# Altium footprint library 7-Connectors-9.PcbLib: 41 footprints (part 3 of 3)
Each footprint in its own frame and in the unit in brackets; x right, y up, seen from the top. Pads: shape width x height; smd on the part's side, far side on the other; paste and mask are expansions set on the pad; w line width, h text height; cw(c..) or ccw(c..) is an arc to the next point about the centre after c.
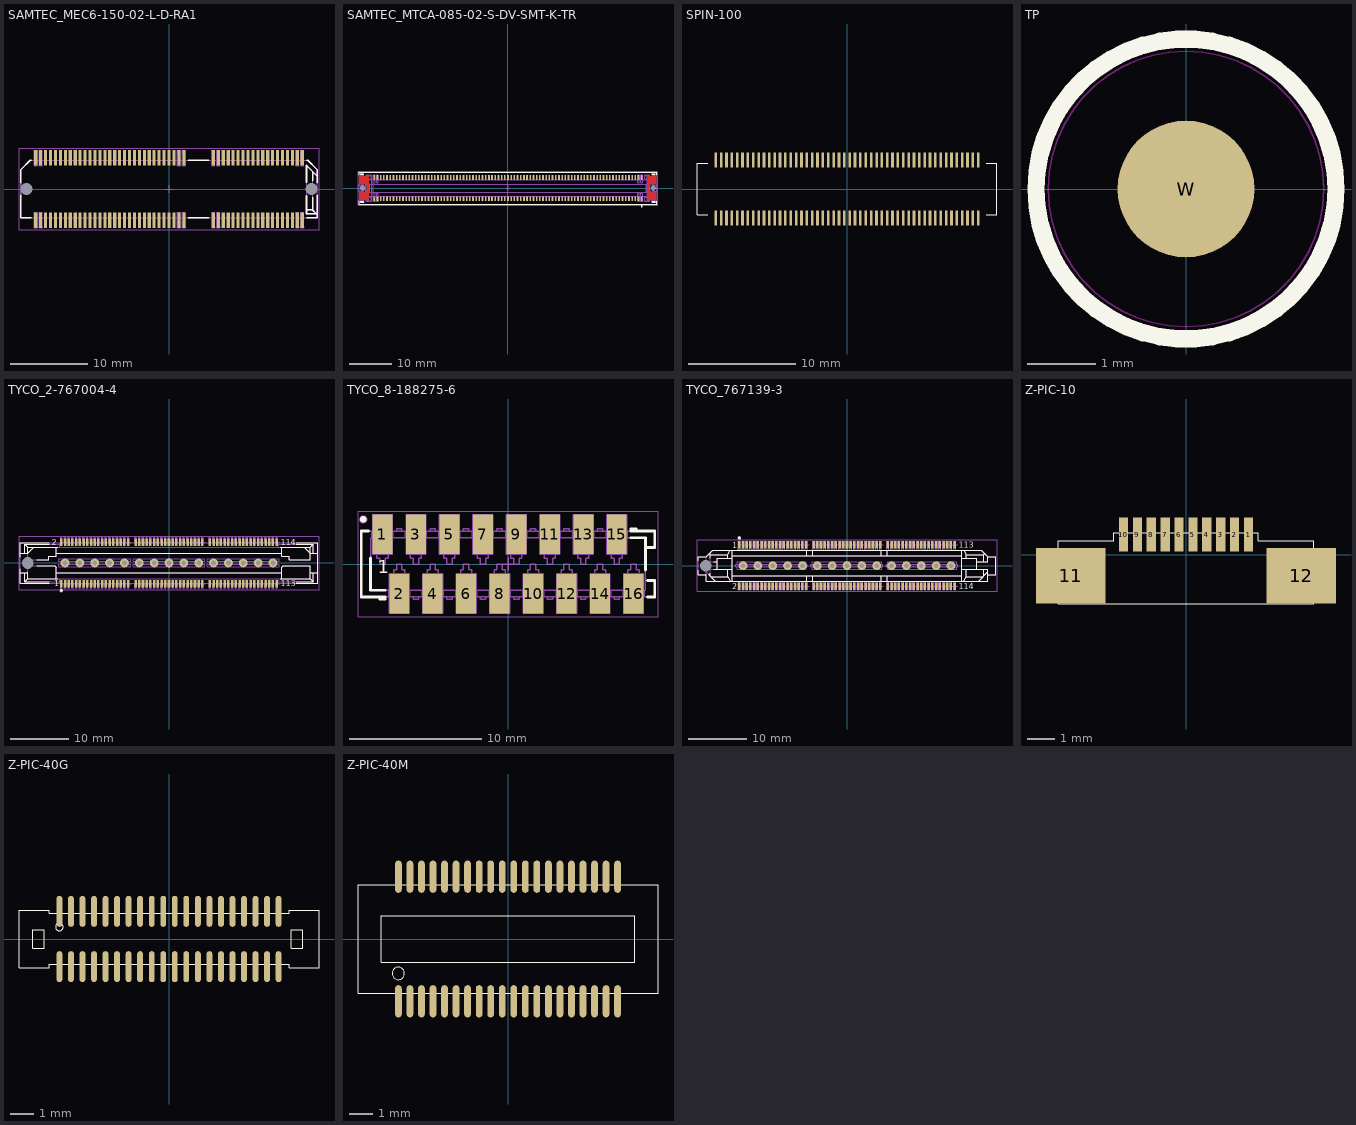
[diagram p2: the footprints below, top view; thin cyan lines are the x and y axes]

## SAMTEC_MEC6-150-02-L-D-RA1 [mm] "100 Contacts, Pitch 0.635mm, Right Angle Micro Edge Card Socket"
height 5.78
pads (102):
  rect 0.4x2 smd mask+0: 1(-17.145,-4) 2(-17.145,4) 3(-16.51,-4) 4(-16.51,4) 5(-15.875,-4) 6(-15.875,4) 7(-15.24,-4) 8(-15.24,4) 9(-14.605,-4) 10(-14.605,4) 11(-13.97,-4) 12(-13.97,4) 13(-13.335,-4) 14(-13.335,4) 15(-12.7,-4) 16(-12.7,4) 17(-12.065,-4) 18(-12.065,4) 19(-11.43,-4) 20(-11.43,4) 21(-10.795,-4) 22(-10.795,4) 23(-10.16,-4) 24(-10.16,4) 25(-9.525,-4) 26(-9.525,4) 27(-8.89,-4) 28(-8.89,4) 29(-8.255,-4) 30(-8.255,4) 31(-7.62,-4) 32(-7.62,4) 33(-6.985,-4) 34(-6.985,4) 35(-6.35,-4) 36(-6.35,4) 37(-5.715,-4) 38(-5.715,4) 39(-5.08,-4) 40(-5.08,4) 41(-4.445,-4) 42(-4.445,4) 43(-3.81,-4) 44(-3.81,4) 45(-3.175,-4) 46(-3.175,4) 47(-2.54,-4) 48(-2.54,4) 49(-1.905,-4) 50(-1.905,4) 51(-1.27,-4) 52(-1.27,4) 53(-0.635,-4) 54(-0.635,4) 55(0,-4) 56(0,4) 57(0.635,-4) 58(0.635,4) 59(1.27,-4) 60(1.27,4) 61(1.905,-4) 62(1.905,4) 63(5.715,-4) 64(5.715,4) 65(6.35,-4) 66(6.35,4) 67(6.985,-4) 68(6.985,4) 69(7.62,-4) 70(7.62,4) 71(8.255,-4) 72(8.255,4) 73(8.89,-4) 74(8.89,4) 75(9.525,-4) 76(9.525,4) 77(10.16,-4) 78(10.16,4) 79(10.795,-4) 80(10.795,4) 81(11.43,-4) 82(11.43,4) 83(12.065,-4) 84(12.065,4) 85(12.7,-4) 86(12.7,4) 87(13.335,-4) 88(13.335,4) 89(13.97,-4) 90(13.97,4) 91(14.605,-4) 92(14.605,4) 93(15.24,-4) 94(15.24,4) 95(15.875,-4) 96(15.875,4) 97(16.51,-4) 98(16.51,4) 99(17.145,-4) 100(17.145,4)
  round 1 hole 1.55 unplated mask+0.275: 101(-18.345,0) 102(18.345,0)
Top Overlay:
  lines w0.2: -19.045,-0.816 -19.045,-3.7 -17.745,-3.7 ; -19.045,0.816 -19.045,2.5 -17.845,3.7 -17.745,3.7 ; 2.505,-3.7 5.115,-3.7 ; 2.505,3.7 5.115,3.7 ; 17.688,-2.65 18.495,-2.65 ; 17.688,-0.87 17.688,-3.2 18.97,-3.2 18.495,-2.725 18.495,-1.06 ; 17.688,0.87 17.688,3.023 19.045,1.666 ; 17.745,-3.7 19.045,-3.7 19.045,-0.792 ; 17.745,3.7 17.845,3.7 19.045,2.5 19.045,0.792 ; 18.495,1.06 18.495,2.216
Mechanical 8:
  lines w0.1: -18.845,0 -18.345,0 ; -18.345,-0.5 -18.345,0 ; -18.345,0.5 -18.345,0 ; -17.845,0 -18.345,0 ; -0.5,0 0,0 ; 0,-0.5 0,0 ; 0,0.5 0,0 ; 0.5,0 0,0 ; 17.845,0 18.345,0 ; 18.345,-0.5 18.345,0 ; 18.345,0.5 18.345,0 ; 18.845,0 18.345,0 ; -17.345,-5 -17.145,-4 -16.945,-5 ; -17.345,-5 -17.345,-3 -16.945,-3 -16.945,-5 ; -17.345,-5 -16.945,-5 ; -17.345,5 -17.145,4 -16.945,5 ; -17.345,5 -17.345,3 -16.945,3 -16.945,5 ; -17.345,5 -16.945,5 ; -16.71,-5 -16.51,-4 -16.31,-5 ; -16.71,-5 -16.71,-3 -16.31,-3 -16.31,-5 ; -16.71,-5 -16.31,-5 ; -16.71,5 -16.51,4 -16.31,5 ; -16.71,5 -16.71,3 -16.31,3 -16.31,5 ; -16.71,5 -16.31,5 ; 1.07,-5 1.27,-4 1.47,-5 ; 1.07,-5 1.07,-3 1.47,-3 1.47,-5 ; 1.07,-5 1.47,-5 ; 1.07,5 1.27,4 1.47,5 ; 1.07,5 1.07,3 1.47,3 1.47,5 ; 1.07,5 1.47,5 ; 1.705,-5 1.905,-4 2.105,-5 ; 1.705,-5 1.705,-3 2.105,-3 2.105,-5 ; 1.705,-5 2.105,-5 ; 1.705,5 1.905,4 2.105,5 ; 1.705,5 1.705,3 2.105,3 2.105,5 ; 1.705,5 2.105,5 ; 5.515,-5 5.715,-4 5.915,-5 ; 5.515,-5 5.515,-3 5.915,-3 5.915,-5 ; 5.515,-5 5.915,-5 ; 5.515,5 5.715,4 5.915,5 ; 5.515,5 5.515,3 5.915,3 5.915,5 ; 5.515,5 5.915,5 ; 6.15,-5 6.35,-4 6.55,-5 ; 6.15,-5 6.15,-3 6.55,-3 6.55,-5 ; 6.15,-5 6.55,-5 ; 6.15,5 6.35,4 6.55,5 ; 6.15,5 6.15,3 6.55,3 6.55,5 ; 6.15,5 6.55,5 ; 16.31,-5 16.51,-4 16.71,-5 ; 16.31,-5 16.31,-3 16.71,-3 16.71,-5 ; 16.31,-5 16.71,-5 ; 16.31,5 16.51,4 16.71,5 ; 16.31,5 16.31,3 16.71,3 16.71,5 ; 16.31,5 16.71,5 ; 16.945,-5 17.145,-4 17.345,-5 ; 16.945,-5 16.945,-3 17.345,-3 17.345,-5 ; 16.945,-5 17.345,-5 ; 16.945,5 17.145,4 17.345,5 ; 16.945,5 16.945,3 17.345,3 17.345,5 ; 16.945,5 17.345,5
Mechanical 14:
  lines w0.1: -19.045,-0.77 -18.915,-0.77 -18.915,0.77 -19.045,0.77 ; 17.688,-2.65 18.495,-2.65 ; 18.495,2.216 18.495,-2.725 18.97,-3.2 17.688,-3.2 17.688,3.023 19.045,1.666 ; -19.045,-3.7 19.045,-3.7 19.045,2.5 17.845,3.7 -17.845,3.7 -19.045,2.5 -19.045,-3.7
Mechanical 15:
  lines w0.05: -19.295,-5.25 19.295,-5.25 19.295,5.25 -19.295,5.25 -19.295,-5.25
3D body "SAMTEC_MEC6-150-02-L-D-RA1.stp": height 5.77, standoff -1.05, extent -19.045,-4.55 19.045,4.55

## SAMTEC_MTCA-085-02-S-DV-SMT-K-TR [mm] "170 Contacts, Pitch 0.75mm, Micro TCA Connector"
height 12.85
pads (172):
  rect 0.4x1.15 smd mask+0: 1(31.5,-2.5) 2(30.75,-2.5) 3(30,-2.5) 4(29.25,-2.5) 5(28.5,-2.5) 6(27.75,-2.5) 7(27,-2.5) 8(26.25,-2.5) 9(25.5,-2.5) 10(24.75,-2.5) 11(24,-2.5) 12(23.25,-2.5) 13(22.5,-2.5) 14(21.75,-2.5) 15(21,-2.5) 16(20.25,-2.5) 17(19.5,-2.5) 18(18.75,-2.5) 19(18,-2.5) 20(17.25,-2.5) 21(16.5,-2.5) 22(15.75,-2.5) 23(15,-2.5) 24(14.25,-2.5) 25(13.5,-2.5) 26(12.75,-2.5) 27(12,-2.5) 28(11.25,-2.5) 29(10.5,-2.5) 30(9.75,-2.5) 31(9,-2.5) 32(8.25,-2.5) 33(7.5,-2.5) 34(6.75,-2.5) 35(6,-2.5) 36(5.25,-2.5) 37(4.5,-2.5) 38(3.75,-2.5) 39(3,-2.5) 40(2.25,-2.5) 41(1.5,-2.5) 42(0.75,-2.5) 43(0,-2.5) 44(-0.75,-2.5) 45(-1.5,-2.5) 46(-2.25,-2.5) 47(-3,-2.5) 48(-3.75,-2.5) 49(-4.5,-2.5) 50(-5.25,-2.5) 51(-6,-2.5) 52(-6.75,-2.5) 53(-7.5,-2.5) 54(-8.25,-2.5) 55(-9,-2.5) 56(-9.75,-2.5) 57(-10.5,-2.5) 58(-11.25,-2.5) 59(-12,-2.5) 60(-12.75,-2.5) 61(-13.5,-2.5) 62(-14.25,-2.5) 63(-15,-2.5) 64(-15.75,-2.5) 65(-16.5,-2.5) 66(-17.25,-2.5) 67(-18,-2.5) 68(-18.75,-2.5) 69(-19.5,-2.5) 70(-20.25,-2.5) 71(-21,-2.5) 72(-21.75,-2.5) 73(-22.5,-2.5) 74(-23.25,-2.5) 75(-24,-2.5) 76(-24.75,-2.5) 77(-25.5,-2.5) 78(-26.25,-2.5) 79(-27,-2.5) 80(-27.75,-2.5) 81(-28.5,-2.5) 82(-29.25,-2.5) 83(-30,-2.5) 84(-30.75,-2.5) 85(-31.5,-2.5) 86(-31.5,2.5) 87(-30.75,2.5) 88(-30,2.5) 89(-29.25,2.5) 90(-28.5,2.5) 91(-27.75,2.5) 92(-27,2.5) 93(-26.25,2.5) 94(-25.5,2.5) 95(-24.75,2.5) 96(-24,2.5) 97(-23.25,2.5) 98(-22.5,2.5) 99(-21.75,2.5) 100(-21,2.5) 101(-20.25,2.5) 102(-19.5,2.5) 103(-18.75,2.5) 104(-18,2.5) 105(-17.25,2.5) 106(-16.5,2.5) 107(-15.75,2.5) 108(-15,2.5) 109(-14.25,2.5) 110(-13.5,2.5) 111(-12.75,2.5) 112(-12,2.5) 113(-11.25,2.5) 114(-10.5,2.5) 115(-9.75,2.5) 116(-9,2.5) 117(-8.25,2.5) 118(-7.5,2.5) 119(-6.75,2.5) 120(-6,2.5) 121(-5.25,2.5) 122(-4.5,2.5) 123(-3.75,2.5) 124(-3,2.5) 125(-2.25,2.5) 126(-1.5,2.5) 127(-0.75,2.5) 128(0,2.5) 129(0.75,2.5) 130(1.5,2.5) 131(2.25,2.5) 132(3,2.5) 133(3.75,2.5) 134(4.5,2.5) 135(5.25,2.5) 136(6,2.5) 137(6.75,2.5) 138(7.5,2.5) 139(8.25,2.5) 140(9,2.5) 141(9.75,2.5) 142(10.5,2.5) 143(11.25,2.5) 144(12,2.5) 145(12.75,2.5) 146(13.5,2.5) 147(14.25,2.5) 148(15,2.5) 149(15.75,2.5) 150(16.5,2.5) 151(17.25,2.5) 152(18,2.5) 153(18.75,2.5) 154(19.5,2.5) 155(20.25,2.5) 156(21,2.5) 157(21.75,2.5) 158(22.5,2.5) 159(23.25,2.5) 160(24,2.5) 161(24.75,2.5) 162(25.5,2.5) 163(26.25,2.5) 164(27,2.5) 165(27.75,2.5) 166(28.5,2.5) 167(29.25,2.5) 168(30,2.5) 169(30.75,2.5) 170(31.5,2.5)
  round 1 hole 1.2 unplated mask+0.1: 171(-34.25,0) 172(34.25,0)
Top Layer:
  region: 34.9,2.75 34.9,1.1 34.25,1.1 34.106,1.091 33.829,1.016 33.58,0.873 33.377,0.67 33.234,0.421 33.159,0.144 33.159,-0.144 33.234,-0.421 33.377,-0.67 33.58,-0.873 33.829,-1.016 34.106,-1.091 34.25,-1.1 34.9,-1.1 34.9,-2.75 32.85,-2.75 32.85,2.75
  region: -34.9,-2.75 -34.9,-1.1 -34.25,-1.1 -34.106,-1.091 -33.829,-1.016 -33.58,-0.873 -33.377,-0.67 -33.234,-0.421 -33.159,-0.144 -33.159,0.144 -33.234,0.421 -33.377,0.67 -33.58,0.873 -33.829,1.016 -34.106,1.091 -34.25,1.1 -34.9,1.1 -34.9,2.75 -32.85,2.75 -32.85,-2.75
Top Overlay:
  circle w0.25: c31.525,-4.3 r0.125
  lines w0.2: -35,-3.15 -35,-3.75 35,-3.75 35,-3.15 ; -35,3.15 -35,3.75 35,3.75 35,3.15 ; -34.75,-3.15 -34.75,-3.35 ; -34.75,3.15 -34.75,3.35 ; -34.55,3.15 -34.75,3.35 ; -34.2,3.15 -34,3.35 ; -34,-3.15 -34,-3.35 ; -34,3.15 -34,3.35 ; 34,-3.15 34,-3.35 ; 34,3.15 34,3.35 ; 34.2,3.15 34,3.35 ; 34.55,3.15 34.75,3.35 ; 34.75,-3.15 34.75,-3.35 ; 34.75,3.15 34.75,3.35 ; -34.75,-3.35 -34,-3.35 ; -34.75,-3.35 -34.55,-3.15 -34.2,-3.15 -34,-3.35 ; -34.75,3.35 -34,3.35 ; 34,-3.35 34.75,-3.35 ; 34,-3.35 34.2,-3.15 34.55,-3.15 34.75,-3.35 ; 34,3.35 34.75,3.35
Mechanical 8:
  circle w0.1: c-34.25,0 r0.6
  lines w0.1: -34.75,0 -34.25,0 ; -34.25,-0.5 -34.25,0 ; -34.25,0.5 -34.25,0 ; -33.75,0 -34.25,0 ; -32.1,-3.075 -32.1,3.075 ; -0.5,0 0,0 ; 0,-0.5 0,0 ; 0,0.5 0,0 ; 0.5,0 0,0 ; 33.75,0 34.25,0 ; 34.25,-0.5 34.25,0 ; 34.25,0.5 34.25,0 ; 34.75,0 34.25,0 ; -31.7,-3.075 -31.7,3.075 ; -31.7,-3.075 -31.3,-3.075 ; -31.7,-3.075 -31.7,-1.925 -31.3,-1.925 -31.3,-3.075 ; -31.7,-3.075 -31.5,-2.5 -31.3,-3.075 ; -31.7,3.075 -31.3,3.075 ; -31.7,3.075 -31.7,1.925 -31.3,1.925 -31.3,3.075 ; -31.7,3.075 -31.5,2.5 -31.3,3.075 ; -30.95,-3.075 -30.55,-3.075 ; -30.95,-3.075 -30.95,-1.925 -30.55,-1.925 -30.55,-3.075 ; -30.95,-3.075 -30.75,-2.5 -30.55,-3.075 ; -30.95,3.075 -30.55,3.075 ; -30.95,3.075 -30.95,1.925 -30.55,1.925 -30.55,3.075 ; -30.95,3.075 -30.75,2.5 -30.55,3.075 ; 30.55,-3.075 30.55,-1.925 30.95,-1.925 30.95,-3.075 ; 30.55,-3.075 30.95,-3.075 ; 30.55,-3.075 30.75,-2.5 30.95,-3.075 ; 30.55,3.075 30.55,1.925 30.95,1.925 30.95,3.075 ; 30.55,3.075 30.95,3.075 ; 30.55,3.075 30.75,2.5 30.95,3.075 ; 31.3,-3.075 31.3,-1.925 31.7,-1.925 31.7,-3.075 ; 31.3,-3.075 31.7,-3.075 ; 31.3,-3.075 31.5,-2.5 31.7,-3.075 ; 31.3,3.075 31.3,1.925 31.7,1.925 31.7,3.075 ; 31.3,3.075 31.7,3.075 ; 31.3,3.075 31.5,2.5 31.7,3.075 ; -34.9,-2.75 -34.9,-1.1 -34.25,-1.1 ccw(c-34.25,0) -34.25,1.1 -34.9,1.1 -34.9,2.75 -32.85,2.75 -32.85,-2.75 -34.9,-2.75 ; 32.85,-2.75 34.9,-2.75 34.9,-1.1 34.25,-1.1 cw(c34.25,0) 34.25,1.1 34.9,1.1 34.9,2.75 32.85,2.75 32.85,-2.75
Mechanical 14:
  lines w0.1: -35,-0.7 -34.525,-0.7 ; -35,0.7 -34.525,0.7 ; -34.525,-3.15 -34.525,3.15 ; -34.525,-1 -34.8,-1 -35,-0.8 -35,0.8 -34.8,1 -34.525,1 ; -34.225,-3.15 -34.225,3.15 ; -33.35,-2.95 -32.205,-2.95 ; -33.35,2.95 -32.205,2.95 ; -31.705,-1.95 -33.575,-1.95 ; -31.705,1.25 -31.705,3.15 -31.295,3.15 -31.295,1.25 ; -31.7,1.25 -31.29,1.25 ; -31.7,1.95 -33.575,1.95 ; -31.295,-1.95 -30.955,-1.95 ; -31.295,1.95 -30.955,1.95 ; -30.545,-1.95 30.545,-1.95 ; -30.545,1.95 30.55,1.95 ; 30.955,-1.95 31.295,-1.95 ; 30.955,1.95 31.295,1.95 ; 31.705,-1.95 33.575,-1.95 ; 31.705,1.95 33.575,1.95 ; 32.205,-2.95 33.35,-2.95 ; 32.205,2.95 33.35,2.95 ; 34.225,-3.15 34.225,3.15 ; 34.525,-3.15 34.525,3.15 ; 34.525,-1 34.8,-1 35,-0.8 35,0.8 34.8,1 34.525,1 ; 34.525,-0.7 35,-0.7 ; 34.525,0.7 35,0.7 ; -35,-2.9 -34.8,-2.7 -34.55,-2.7 ; -35,-2.9 -35,-3.75 35,-3.75 35,-2.9 ; -35,-2.9 -34.75,-2.9 ; -35,2.9 -35,3.75 35,3.75 35,2.9 ; -35,2.9 -34.8,2.7 -34.55,2.7 ; -35,2.9 -34.75,2.9 ; -34.75,-3.35 -34.75,-2.9 ; -34.75,-3.35 -34,-3.35 ; -34.75,-3.35 -34.55,-3.15 ; -34.75,-2.9 -34.55,-2.7 ; -34.75,2.9 -34.75,3.35 ; -34.75,2.9 -34.55,2.7 ; -34.75,3.35 -34,3.35 ; -34.75,3.35 -34.55,3.15 ; -34.55,-3.15 -34.2,-3.15 ; -34.55,-3.15 -34.55,-2.7 ; -34.55,2.7 -34.55,3.15 ; -34.55,3.15 -34.2,3.15 ; -34.2,-3.15 -34.2,3.15 ; -34.2,-3.15 -34,-3.35 ; -34.2,3.15 -34,3.35 ; -34,-3.35 -34,3.35 ; -33.575,-1.95 -33.575,1.95 ; -33.575,-1.95 -32.575,-0.95 ; -33.575,1.95 -32.575,0.95 ; -32.575,-0.95 32.575,-0.95 ; -32.575,-0.95 -32.575,0.95 ; -32.575,0.95 32.575,0.95 ; 32.575,-0.95 32.575,0.95 ; 32.575,-0.95 33.575,-1.95 ; 32.575,0.95 33.575,1.95 ; 33.575,-1.95 33.575,1.95 ; 34,-3.35 34.75,-3.35 ; 34,-3.35 34.2,-3.15 ; 34,-3.35 34,3.35 ; 34,3.35 34.2,3.15 ; 34,3.35 34.75,3.35 ; 34.2,-3.15 34.2,3.15 ; 34.2,-3.15 34.55,-3.15 ; 34.2,3.15 34.55,3.15 ; 34.55,-3.15 34.55,-2.7 ; 34.55,-3.15 34.75,-3.35 ; 34.55,-2.7 34.8,-2.7 35,-2.9 ; 34.55,-2.7 34.75,-2.9 ; 34.55,2.7 34.8,2.7 35,2.9 ; 34.55,2.7 34.55,3.15 ; 34.55,2.7 34.75,2.9 ; 34.55,3.15 34.75,3.35 ; 34.75,-3.35 34.75,-2.9 ; 34.75,-2.9 35,-2.9 ; 34.75,2.9 34.75,3.35 ; 34.75,2.9 35,2.9 ; -33.35,-3.15 -33.35,-2.15 -32.205,-2.15 -32.205,-3.15 -33.35,-3.15 ; -33.35,2.15 -32.205,2.15 -32.205,3.15 -33.35,3.15 -33.35,2.15 ; -31.705,-3.15 -31.295,-3.15 -31.295,-1.25 -31.705,-1.25 -31.705,-3.15 ; -30.955,-3.15 -30.955,-1.25 -30.545,-1.25 -30.545,-3.15 -30.955,-3.15 ; -30.955,1.25 -30.545,1.25 -30.545,3.15 -30.955,3.15 -30.955,1.25 ; 30.545,-3.15 30.955,-3.15 30.955,-1.25 30.545,-1.25 30.545,-3.15 ; 30.545,1.25 30.545,3.15 30.955,3.15 30.955,1.25 30.545,1.25 ; 31.295,-3.15 31.295,-1.25 31.705,-1.25 31.705,-3.15 31.295,-3.15 ; 31.295,1.25 31.705,1.25 31.705,3.15 31.295,3.15 31.295,1.25 ; 32.205,-3.15 32.205,-2.15 33.35,-2.15 33.35,-3.15 32.205,-3.15 ; 32.205,2.15 32.205,3.15 33.35,3.15 33.35,2.15 32.205,2.15
Mechanical 15:
  lines w0.05: -35.25,-4 -35.25,4 35.25,4 35.25,-4 -35.25,-4
3D body "SAMTEC_MTCA-085-02-S-DV-SMT-K-TR.stp": height 12.85, standoff -1.39, extent -35,-3.75 35,3.75

## SPIN-100 [mm]
height 26.5
pads (100):
  rect 0.25x1.4 smd mask+0.051: 1(-12.25,-2.7) 2(-11.75,-2.7) 3(-11.25,-2.7) 4(-10.75,-2.7) 5(-10.25,-2.7) 6(-9.75,-2.7) 7(-9.25,-2.7) 8(-8.75,-2.7) 9(-8.25,-2.7) 10(-7.75,-2.7) 11(-7.25,-2.7) 12(-6.75,-2.7) 13(-6.25,-2.7) 14(-5.75,-2.7) 15(-5.25,-2.7) 16(-4.75,-2.7) 17(-4.25,-2.7) 18(-3.75,-2.7) 19(-3.25,-2.7) 20(-2.75,-2.7) 21(-2.25,-2.7) 22(-1.75,-2.7) 23(-1.25,-2.7) 24(-0.75,-2.7) 25(-0.25,-2.7) 26(0.25,-2.7) 27(0.75,-2.7) 28(1.25,-2.7) 29(1.75,-2.7) 30(2.25,-2.7) 31(2.75,-2.7) 32(3.25,-2.7) 33(3.75,-2.7) 34(4.25,-2.7) 35(4.75,-2.7) 36(5.25,-2.7) 37(5.75,-2.7) 38(6.25,-2.7) 39(6.75,-2.7) 40(7.25,-2.7) 41(7.75,-2.7) 42(8.25,-2.7) 43(8.75,-2.7) 44(9.25,-2.7) 45(9.75,-2.7) 46(10.25,-2.7) 47(10.75,-2.7) 48(11.25,-2.7) 49(11.75,-2.7) 50(12.25,-2.7) 51(12.25,2.7) 52(11.75,2.7) 53(11.25,2.7) 54(10.75,2.7) 55(10.25,2.7) 56(9.75,2.7) 57(9.25,2.7) 58(8.75,2.7) 59(8.25,2.7) 60(7.75,2.7) 61(7.25,2.7) 62(6.75,2.7) 63(6.25,2.7) 64(5.75,2.7) 65(5.25,2.7) 66(4.75,2.7) 67(4.25,2.7) 68(3.75,2.7) 69(3.25,2.7) 70(2.775,2.7) 71(2.25,2.7) 72(1.75,2.7) 73(1.25,2.7) 74(0.75,2.7) 75(0.25,2.7) 76(-0.25,2.7) 77(-0.75,2.7) 78(-1.25,2.7) 79(-1.75,2.7) 80(-2.25,2.7) 81(-2.75,2.7) 82(-3.25,2.7) 83(-3.75,2.7) 84(-4.25,2.7) 85(-4.75,2.7) 86(-5.25,2.7) 87(-5.75,2.7) 88(-6.25,2.7) 89(-6.75,2.7) 90(-7.25,2.7) 91(-7.75,2.7) 92(-8.25,2.7) 93(-8.75,2.7) 94(-9.25,2.7) 95(-9.75,2.7) 96(-10.25,2.7) 97(-10.75,2.7) 98(-11.25,2.7) 99(-11.75,2.7) 100(-12.25,2.7)
Top Overlay:
  lines w0.076: -13,-2.4 -14,-2.4 -14,2.4 -13,2.4 ; 13,-2.4 14,-2.4 14,2.4 13,2.4

## TP [mm]
height 11.7
pads (1):
  round 2 smd mask+1: W(0,0)
Top Overlay:
  circle w0.254: c0,0 r2.195
Keep-Out Layer:
  circle w0.025: c0,0 r2.017
3D body "1_016-1_016-3_tp.stp": height 0.02, standoff 0, extent -1.5,-1.5 1.5,1.5

## TYCO_2-767004-4 [mm] "114 Positions, Pitch 25 [0.64], Centerline Matched Impedance Vertical Receptacle (MICTOR)"
height 6.35
pads (130):
  rect 0.43x1.27 smd: 1(-18.415,-3.531) 2(-18.415,3.531) 3(-17.78,-3.531) 4(-17.78,3.531) 5(-17.145,-3.531) 6(-17.145,3.531) 7(-16.51,-3.531) 8(-16.51,3.531) 9(-15.875,-3.531) 10(-15.875,3.531) 11(-15.24,-3.531) 12(-15.24,3.531) 13(-14.605,-3.531) 14(-14.605,3.531) 15(-13.97,-3.531) 16(-13.97,3.531) 17(-13.335,-3.531) 18(-13.335,3.531) 19(-12.7,-3.531) 20(-12.7,3.531) 21(-12.065,-3.531) 22(-12.065,3.531) 23(-11.43,-3.531) 24(-11.43,3.531) 25(-10.795,-3.531) 26(-10.795,3.531) 27(-10.16,-3.531) 28(-10.16,3.531) 29(-9.525,-3.531) 30(-9.525,3.531) 31(-8.89,-3.531) 32(-8.89,3.531) 33(-8.255,-3.531) 34(-8.255,3.531) 35(-7.62,-3.531) 36(-7.62,3.531) 37(-6.985,-3.531) 38(-6.985,3.531) 39(-5.715,-3.531) 40(-5.715,3.531) 41(-5.08,-3.531) 42(-5.08,3.531) 43(-4.445,-3.531) 44(-4.445,3.531) 45(-3.81,-3.531) 46(-3.81,3.531) 47(-3.175,-3.531) 48(-3.175,3.531) 49(-2.54,-3.531) 50(-2.54,3.531) 51(-1.905,-3.531) 52(-1.905,3.531) 53(-1.27,-3.531) 54(-1.27,3.531) 55(-0.635,-3.531) 56(-0.635,3.531) 57(0,-3.531) 58(0,3.531) 59(0.635,-3.531) 60(0.635,3.531) 61(1.27,-3.531) 62(1.27,3.531) 63(1.905,-3.531) 64(1.905,3.531) 65(2.54,-3.531) 66(2.54,3.531) 67(3.175,-3.531) 68(3.175,3.531) 69(3.81,-3.531) 70(3.81,3.531) 71(4.445,-3.531) 72(4.445,3.531) 73(5.08,-3.531) 74(5.08,3.531) 75(5.715,-3.531) 76(5.715,3.531) 77(6.985,-3.531) 78(6.985,3.531) 79(7.62,-3.531) 80(7.62,3.531) 81(8.255,-3.531) 82(8.255,3.531) 83(8.89,-3.531) 84(8.89,3.531) 85(9.525,-3.531) 86(9.525,3.531) 87(10.16,-3.531) 88(10.16,3.531) 89(10.795,-3.531) 90(10.795,3.531) 91(11.43,-3.531) 92(11.43,3.531) 93(12.065,-3.531) 94(12.065,3.531) 95(12.7,-3.531) 96(12.7,3.531) 97(13.335,-3.531) 98(13.335,3.531) 99(13.97,-3.531) 100(13.97,3.531) 101(14.605,-3.531) 102(14.605,3.531) 103(15.24,-3.531) 104(15.24,3.531) 105(15.875,-3.531) 106(15.875,3.531) 107(16.51,-3.531) 108(16.51,3.531) 109(17.145,-3.531) 110(17.145,3.531) 111(17.78,-3.531) 112(17.78,3.531) 113(18.415,-3.531) 114(18.415,3.531)
  round 1.5 hole 0.8: 115(17.78,0) 116(15.24,0) 117(12.7,0) 118(10.16,0) 119(7.62,0) 120(5.08,0) 121(2.54,0) 122(0,0) 123(-2.54,0) 124(-5.08,0) 125(-7.62,0) 126(-10.16,0) 127(-12.7,0) 128(-15.24,0) 129(-17.78,0)
  round 1 hole 2 unplated: 130(-24.13,0)
Top Overlay:
  circle w0.25: c-18.415,-4.716 r0.125
  lines w0.2: -25.4,-1.676 -24.13,-1.676 ; -25.4,-0.973 -25.4,-3.454 -20.5,-3.454 ; -25.4,0.973 -25.4,3.454 -20.5,3.454 ; -25.4,1.676 -24.13,1.676 -23.114,2.692 ; -24.638,-1.676 -24.638,-3.2 ; -24.638,1.676 -24.638,3.2 ; -24.13,-1.6 -24.13,-2.692 ; -24.13,1.6 -24.13,2.692 ; -22.613,-0.508 -19.507,-0.508 -19.253,-0.762 -19.253,-2.692 ; -22.613,0.508 -20.523,0.508 -20.523,1.143 -19.253,1.143 -19.253,2.692 ; -20.5,-3.2 -24.638,-3.2 ; -20.5,3.2 -24.638,3.2 ; -19.253,-1.676 19.253,-1.676 ; -19.253,1.676 19.253,1.676 ; -19.03,-2.692 -24.13,-2.692 ; -19.03,2.692 -24.13,2.692 ; 19.03,-2.692 24.13,-2.692 ; 19.03,2.692 24.13,2.692 ; 19.253,-2.692 19.253,-0.762 19.507,-0.508 24.13,-0.508 24.13,-2.692 ; 19.253,2.692 19.253,1.143 20.523,1.143 20.523,0.508 24.13,0.508 24.13,2.692 ; 21.8,-3.454 25.4,-3.454 25.4,3.454 21.8,3.454 ; 21.8,-3.2 24.638,-3.2 ; 21.8,3.2 24.638,3.2 ; 23.114,2.692 24.13,1.676 25.4,1.676 ; 24.13,-1.676 25.4,-1.676 ; 24.638,-1.676 24.638,-3.2 ; 24.638,1.676 24.638,3.2 ; -24.638,-3.2 -24.13,-2.692 ; -24.638,3.2 -24.13,2.692 ; 24.13,-2.692 24.638,-3.2 ; 24.13,2.692 24.638,3.2
  text "114" at 19.075,3.05 h1
  text "113" at 19.1,-4.025 h1
  text "2" at -20.05,3.05 h1
  text "1" at -19.6,-4.025 h1
Mechanical 8:
  drawing of 406 lines, arcs and shapes, not listed
Mechanical 14:
  drawing of 415 lines, arcs and shapes, not listed
Mechanical 15:
  lines w0.05: -25.65,-4.606 25.65,-4.606 25.65,4.606 -25.65,4.606 -25.65,-4.606
3D body "TYCO_2-767004-4.stp": height 6.1, standoff -1.3, extent -25.4,-4.356 25.4,4.356

## TYCO_8-188275-6 [mm] "16 contacts, 1.27mm Centerline, Micro-MaTch Surface Mount, Board-Board & Ribbon-Board Female Connectors"
height 5.3
pads (16):
  rect 1.5x3 smd: 1(-9.525,2.25) 2(-8.255,-2.25) 3(-6.985,2.25) 4(-5.715,-2.25) 5(-4.445,2.25) 6(-3.175,-2.25) 7(-1.905,2.25) 8(-0.635,-2.25) 9(0.635,2.25) 10(1.905,-2.25) 11(3.175,2.25) 12(4.445,-2.25) 13(5.715,2.25) 14(6.985,-2.25) 15(8.255,2.25) 16(9.525,-2.25)
Top Overlay:
  circle w0.25: c-10.975,3.385 r0.125
  lines w0.2: -10.575,2.5 -11.125,2.5 -11.125,-2.5 -9.305,-2.5 ; -10.425,0.45 -10.425,-2 -9.305,-2 ; -9.725,-2.5 -9.725,-2.67 -9.325,-2.67 -9.325,-2.5 ; 9.305,2 10.425,2 10.425,-0.45 10.425,1.25 11.125,1.25 11.125,2.5 9.305,2.5 ; 9.325,2.5 9.325,2.67 9.725,2.67 9.725,2.5 ; 10.575,-2.5 11.125,-2.5 11.125,-1.25 10.575,-1.25
  text "1" at -9.875,-0.701 h1
Mechanical 8:
  drawing of 200 lines, arcs and shapes, not listed
Mechanical 14:
  drawing of 333 lines, arcs and shapes, not listed
  text "1" at -9.875,-0.701 h1
Mechanical 15:
  lines w0.025: -11.375,-4 -11.375,4 11.375,4 11.375,-4 -11.375,-4
3D body "TYCO_8-188275-6.stp": height 5.25, standoff 0, extent -11.125,-3.45 11.125,3.456

## TYCO_767139-3 [mm] "114 Positions, Pitch 25 [0.64], Centerline Matched Impedance Vertical Plug (MICTOR)"
height 9.14
pads (130):
  rect 0.43x1.27 smd: 1(-18.415,3.531) 2(-18.415,-3.531) 3(-17.78,3.531) 4(-17.78,-3.531) 5(-17.145,3.531) 6(-17.145,-3.531) 7(-16.51,3.531) 8(-16.51,-3.531) 9(-15.875,3.531) 10(-15.875,-3.531) 11(-15.24,3.531) 12(-15.24,-3.531) 13(-14.605,3.531) 14(-14.605,-3.531) 15(-13.97,3.531) 16(-13.97,-3.531) 17(-13.335,3.531) 18(-13.335,-3.531) 19(-12.7,3.531) 20(-12.7,-3.531) 21(-12.065,3.531) 22(-12.065,-3.531) 23(-11.43,3.531) 24(-11.43,-3.531) 25(-10.795,3.531) 26(-10.795,-3.531) 27(-10.16,3.531) 28(-10.16,-3.531) 29(-9.525,3.531) 30(-9.525,-3.531) 31(-8.89,3.531) 32(-8.89,-3.531) 33(-8.255,3.531) 34(-8.255,-3.531) 35(-7.62,3.531) 36(-7.62,-3.531) 37(-6.985,3.531) 38(-6.985,-3.531) 39(-5.715,3.531) 40(-5.715,-3.531) 41(-5.08,3.531) 42(-5.08,-3.531) 43(-4.445,3.531) 44(-4.445,-3.531) 45(-3.81,3.531) 46(-3.81,-3.531) 47(-3.175,3.531) 48(-3.175,-3.531) 49(-2.54,3.531) 50(-2.54,-3.531) 51(-1.905,3.531) 52(-1.905,-3.531) 53(-1.27,3.531) 54(-1.27,-3.531) 55(-0.635,3.531) 56(-0.635,-3.531) 57(0,3.531) 58(0,-3.531) 59(0.635,3.531) 60(0.635,-3.531) 61(1.27,3.531) 62(1.27,-3.531) 63(1.905,3.531) 64(1.905,-3.531) 65(2.54,3.531) 66(2.54,-3.531) 67(3.175,3.531) 68(3.175,-3.531) 69(3.81,3.531) 70(3.81,-3.531) 71(4.445,3.531) 72(4.445,-3.531) 73(5.08,3.531) 74(5.08,-3.531) 75(5.715,3.531) 76(5.715,-3.531) 77(6.985,3.531) 78(6.985,-3.531) 79(7.62,3.531) 80(7.62,-3.531) 81(8.255,3.531) 82(8.255,-3.531) 83(8.89,3.531) 84(8.89,-3.531) 85(9.525,3.531) 86(9.525,-3.531) 87(10.16,3.531) 88(10.16,-3.531) 89(10.795,3.531) 90(10.795,-3.531) 91(11.43,3.531) 92(11.43,-3.531) 93(12.065,3.531) 94(12.065,-3.531) 95(12.7,3.531) 96(12.7,-3.531) 97(13.335,3.531) 98(13.335,-3.531) 99(13.97,3.531) 100(13.97,-3.531) 101(14.605,3.531) 102(14.605,-3.531) 103(15.24,3.531) 104(15.24,-3.531) 105(15.875,3.531) 106(15.875,-3.531) 107(16.51,3.531) 108(16.51,-3.531) 109(17.145,3.531) 110(17.145,-3.531) 111(17.78,3.531) 112(17.78,-3.531) 113(18.415,3.531) 114(18.415,-3.531)
  round 1.5 hole 0.8: 115(17.78,0) 116(15.24,0) 117(12.7,0) 118(10.16,0) 119(7.62,0) 120(5.08,0) 121(2.54,0) 122(0,0) 123(-2.54,0) 124(-5.08,0) 125(-7.62,0) 126(-10.16,0) 127(-12.7,0) 128(-15.24,0) 129(-17.78,0)
  round 1 hole 2 unplated: 130(-24.13,0)
Top Overlay:
  circle w0.25: c-18.415,4.716 r0.125
  lines w0.2: -25.4,-0.798 -25.4,-1.524 -24.105,-1.524 ; -25.4,0.798 -25.4,1.524 -24.105,1.524 ; -24.105,-1.5 -24.105,-2.642 24.105,-2.642 24.105,-0.635 19.66,-0.635 ; -24.105,1.5 -24.105,1.524 ; -23.707,-1.439 -22.504,-2.642 ; -23.546,2.083 -23.343,1.88 ; -23.343,-1.803 -23.343,-1.277 ; -23.343,1.277 -23.343,1.88 ; -23.266,-1.88 -20.422,-1.88 ; -22.771,-0.635 -19.66,-0.635 ; -22.771,0.635 -22.2,0.635 ; -22.2,-0.635 -22.2,1.27 -19.66,1.27 ; -20.422,-0.635 -20.422,-1.88 ; -20.422,1.27 -20.422,1.88 ; -19.982,-2.642 -20.422,-1.88 ; -19.982,2.642 -20.422,1.88 ; -19.66,-2.642 -19.66,2.642 ; -19.66,-1.714 19.66,-1.714 ; -19.66,1.714 19.66,1.714 ; -6.858,-2.642 -6.858,-1.714 ; -6.858,1.714 -6.858,2.642 ; -5.842,-2.642 -5.842,-1.714 ; -5.842,1.714 -5.842,2.642 ; 5.842,-2.642 5.842,-1.714 ; 5.842,1.714 5.842,2.642 ; 6.858,-2.642 6.858,-1.714 ; 6.858,1.714 6.858,2.642 ; 19.66,-2.642 19.66,2.642 ; 19.66,1.27 22.2,1.27 22.2,-0.635 ; 19.982,-2.642 20.422,-1.88 ; 19.982,2.642 20.422,1.88 ; 20.422,-0.635 20.422,-1.88 ; 20.422,1.27 20.422,1.88 ; 22.2,0.635 24.105,0.635 24.105,1.524 ; 22.504,-2.642 24.105,-1.041 ; 23.266,-1.88 20.422,-1.88 ; 23.343,-1.803 23.343,-0.635 ; 23.343,0.635 23.343,1.88 ; 23.546,2.083 23.343,1.88 ; 24.105,-1.524 25.4,-1.524 25.4,1.524 24.105,1.524 ; -24.105,1.524 -22.987,2.642 22.987,2.642 24.105,1.524 ; -23.343,1.88 -20.422,1.88 ; 20.422,1.88 23.343,1.88
  text "113" at 19.075,3.05 h1
  text "114" at 19.1,-4.025 h1
  text "1" at -19.625,2.95 h1
  text "2" at -19.6,-4.025 h1
Mechanical 8:
  drawing of 812 lines, arcs and shapes, not listed
Mechanical 14:
  drawing of 446 lines, arcs and shapes, not listed
Mechanical 15:
  lines w0.1: -25.65,-4.416 -25.65,4.416 25.65,4.416 25.65,-4.416 -25.65,-4.416
3D body "TYCO_767139-3.stp": height 8.86, standoff -1.52, extent -25.4,-4.166 25.4,4.166

## Z-PIC-10 [mil]
height 728.35
pads (12):
  rect 13x48 smd mask+2: 1(88.58,28.5) 2(68.9,28.5) 3(49.21,28.5) 4(29.53,28.5) 5(9.84,28.5) 6(-9.84,28.5) 7(-29.53,28.5) 8(-49.21,28.5) 9(-68.9,28.5) 10(-88.58,28.5)
  rect 98.43x78.74 smd mask+2: 11(-163.39,-29.53) 12(163.39,-29.53)
Top Overlay:
  lines w0.79: -181.1,-69.29 181.1,-69.29 181.1,19.68 102.36,19.68 102.36,31.5 -102.36,31.5 -102.36,19.68 -181.1,19.68 -181.1,-69.29

## Z-PIC-40G [mm]
height 18.5
pads (40):
  oval 0.254x1.346 smd mask+0.051: 1(-4.75,1.2) 2(-4.25,1.2) 3(-3.75,1.2) 4(-3.25,1.2) 5(-2.75,1.2) 6(-2.25,1.2) 7(-1.75,1.2) 8(-1.25,1.2) 9(-0.75,1.2) 10(-0.25,1.2) 11(0.25,1.2) 12(0.75,1.2) 13(1.25,1.2) 14(1.75,1.2) 15(2.25,1.2) 16(2.75,1.2) 17(3.25,1.2) 18(3.75,1.2) 19(4.25,1.2) 20(4.75,1.2) 21(4.75,-1.2) 22(4.25,-1.2) 23(3.75,-1.2) 24(3.25,-1.2) 25(2.75,-1.2) 26(2.25,-1.2) 27(1.75,-1.2) 28(1.25,-1.2) 29(0.75,-1.2) 30(0.25,-1.2) 31(-0.25,-1.2) 32(-0.75,-1.2) 33(-1.25,-1.2) 34(-1.75,-1.2) 35(-2.25,-1.2) 36(-2.75,-1.2) 37(-3.25,-1.2) 38(-3.75,-1.2) 39(-4.25,-1.2) 40(-4.75,-1.2)
Top Overlay:
  circle w0.02: c-4.754,0.52 r0.164
  lines w0.02: -6.5,-1.25 -5.2,-1.25 -5.2,-1.1 5.2,-1.1 5.2,-1.25 6.5,-1.25 6.5,1.25 5.2,1.25 5.2,1.11 -5.2,1.11 -5.2,1.25 -6.5,1.25 -6.5,-1.25 ; -5.91,-0.4 -5.91,0.41 -5.4,0.41 -5.4,-0.4 -5.91,-0.4 ; 5.3,-0.4 5.8,-0.4 5.8,0.4 5.3,0.4 5.3,-0.4

## Z-PIC-40M [mm]
height 18.5
pads (40):
  oval 0.292x1.397 smd mask+0.051: 1(-4.75,-2.7) 2(-4.25,-2.7) 3(-3.75,-2.7) 4(-3.25,-2.7) 5(-2.75,-2.7) 6(-2.25,-2.7) 7(-1.75,-2.7) 8(-1.25,-2.7) 9(-0.75,-2.7) 10(-0.25,-2.7) 11(0.25,-2.7) 12(0.75,-2.7) 13(1.25,-2.7) 14(1.75,-2.7) 15(2.25,-2.7) 16(2.75,-2.7) 17(3.25,-2.7) 18(3.75,-2.7) 19(4.25,-2.7) 20(4.75,-2.7) 21(4.75,2.7) 22(4.25,2.7) 23(3.75,2.7) 24(3.25,2.7) 25(2.75,2.7) 26(2.25,2.7) 27(1.75,2.7) 28(1.25,2.7) 29(0.75,2.7) 30(0.25,2.7) 31(-0.25,2.7) 32(-0.75,2.7) 33(-1.25,2.7) 34(-1.75,2.7) 35(-2.25,2.7) 36(-2.75,2.7) 37(-3.25,2.7) 38(-3.75,2.7) 39(-4.25,2.7) 40(-4.75,2.7)
Top Overlay:
  circle w0.02: c-4.753,-1.49 r0.267
  lines w0.01: -5.5,-1 5.5,-1 5.5,1 -5.5,1 -5.5,-1
  lines w0.02: -6.5,-2.35 6.5,-2.35 6.5,2.35 -6.5,2.35 -6.5,-2.35